# Altium schematic symbol library Regulator_Linear.SchLib: 1452 symbols (part 9 of 10)
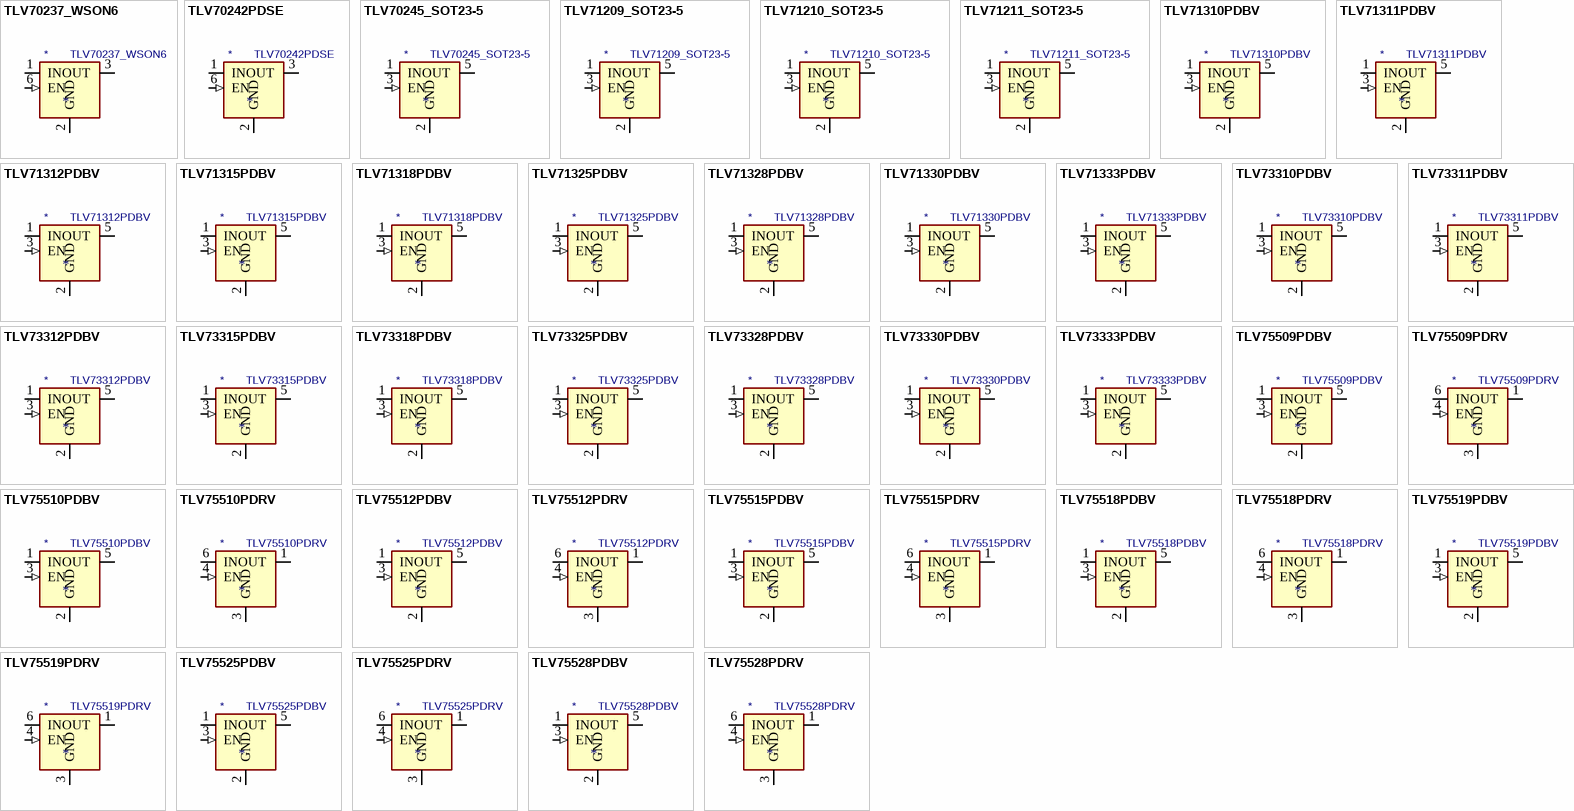
[diagram p44: symbols TLV70237_WSON6 to TLV75528PDRV]

## TLV73318PDBV
designator *  value TLV73318PDBV
ki_keywords: 300mA LDO Regulator Fixed Positive Capacitor-Free; ki_description: 300mA Capacitor-Free Low Dropout Voltage Regulator, Fixed Output 1.8V, SOT-23-5; ki_fp_filters: SOT?23*; Footprint: Package_TO_SOT_SMD:SOT-23-5; Supplier: http://www.ti.com/lit/ds/symlink/tlv733p.pdf
footprint SOT-23-5
pins: 1 IN (power), 2 GND (power), 3 EN (in), 4 NC (in) hidden, 5 OUT (power)

## TLV73325PDBV
designator *  value TLV73325PDBV
ki_keywords: 300mA LDO Regulator Fixed Positive Capacitor-Free; ki_description: 300mA Capacitor-Free Low Dropout Voltage Regulator, Fixed Output 2.5V, SOT-23-5; ki_fp_filters: SOT?23*; Footprint: Package_TO_SOT_SMD:SOT-23-5; Supplier: http://www.ti.com/lit/ds/symlink/tlv733p.pdf
footprint SOT-23-5
pins: 1 IN (power), 2 GND (power), 3 EN (in), 4 NC (in) hidden, 5 OUT (power)

## TLV73328PDBV
designator *  value TLV73328PDBV
ki_keywords: 300mA LDO Regulator Fixed Positive Capacitor-Free; ki_description: 300mA Capacitor-Free Low Dropout Voltage Regulator, Fixed Output 2.8V, SOT-23-5; ki_fp_filters: SOT?23*; Footprint: Package_TO_SOT_SMD:SOT-23-5; Supplier: http://www.ti.com/lit/ds/symlink/tlv733p.pdf
footprint SOT-23-5
pins: 1 IN (power), 2 GND (power), 3 EN (in), 4 NC (in) hidden, 5 OUT (power)

## TLV73330PDBV
designator *  value TLV73330PDBV
ki_keywords: 300mA LDO Regulator Fixed Positive Capacitor-Free; ki_description: 300mA Capacitor-Free Low Dropout Voltage Regulator, Fixed Output 3.0V, SOT-23-5; ki_fp_filters: SOT?23*; Footprint: Package_TO_SOT_SMD:SOT-23-5; Supplier: http://www.ti.com/lit/ds/symlink/tlv733p.pdf
footprint SOT-23-5
pins: 1 IN (power), 2 GND (power), 3 EN (in), 4 NC (in) hidden, 5 OUT (power)

## TLV73333PDBV
designator *  value TLV73333PDBV
ki_keywords: 300mA LDO Regulator Fixed Positive Capacitor-Free; ki_description: 300mA Capacitor-Free Low Dropout Voltage Regulator, Fixed Output 3.3V, SOT-23-5; ki_fp_filters: SOT?23*; Footprint: Package_TO_SOT_SMD:SOT-23-5; Supplier: http://www.ti.com/lit/ds/symlink/tlv733p.pdf
footprint SOT-23-5
pins: 1 IN (power), 2 GND (power), 3 EN (in), 4 NC (in) hidden, 5 OUT (power)

## TLV75509PDBV
designator *  value TLV75509PDBV
ki_keywords: LDO Regulator Fixed Positive; ki_description: 500mA Low IQ Small Size Low Dropout Voltage Regulator, Fixed Output 0.9V, SOT-23-5; ki_fp_filters: SOT?23*; Footprint: Package_TO_SOT_SMD:SOT-23-5; Supplier: http://www.ti.com/lit/ds/symlink/tlv755p.pdf
footprint SOT-23-5
pins: 1 IN (power), 2 GND (power), 3 EN (in), 4 NC (in) hidden, 5 OUT (power)

## TLV75509PDRV
designator *  value TLV75509PDRV
ki_keywords: LDO Regulator Fixed Positive; ki_description: 500mA Low Dropout Voltage Regulator, Fixed Output 0.9V, WSON6; ki_fp_filters: WSON*1EP*2x2mm*P0.65mm*; Footprint: Package_SON:WSON-6-1EP_2x2mm_P0.65mm_EP1x1.6mm; Supplier: http://www.ti.com/lit/ds/symlink/tlv755p.pdf
footprint WSON-6-1EP_2x2mm_P0.65mm_EP1x1.6mm
pins: 1 OUT (power), 2 NC (in) hidden, 3 GND (power), 4 EN (in), 5 NC (in) hidden, 6 IN (power), 7 GND hidden

## TLV75510PDBV
designator *  value TLV75510PDBV
ki_keywords: LDO Regulator Fixed Positive; ki_description: 500mA Low IQ Small Size Low Dropout Voltage Regulator, Fixed Output 1.0V, SOT-23-5; ki_fp_filters: SOT?23*; Footprint: Package_TO_SOT_SMD:SOT-23-5; Supplier: http://www.ti.com/lit/ds/symlink/tlv755p.pdf
footprint SOT-23-5
pins: 1 IN (power), 2 GND (power), 3 EN (in), 4 NC (in) hidden, 5 OUT (power)

## TLV75510PDRV
designator *  value TLV75510PDRV
ki_keywords: LDO Regulator Fixed Positive; ki_description: 500mA Low Dropout Voltage Regulator, Fixed Output 1.0V, WSON6; ki_fp_filters: WSON*1EP*2x2mm*P0.65mm*; Footprint: Package_SON:WSON-6-1EP_2x2mm_P0.65mm_EP1x1.6mm; Supplier: http://www.ti.com/lit/ds/symlink/tlv755p.pdf
footprint WSON-6-1EP_2x2mm_P0.65mm_EP1x1.6mm
pins: 1 OUT (power), 2 NC (in) hidden, 3 GND (power), 4 EN (in), 5 NC (in) hidden, 6 IN (power), 7 GND hidden

## TLV75512PDBV
designator *  value TLV75512PDBV
ki_keywords: LDO Regulator Fixed Positive; ki_description: 500mA Low IQ Small Size Low Dropout Voltage Regulator, Fixed Output 1.2V, SOT-23-5; ki_fp_filters: SOT?23*; Footprint: Package_TO_SOT_SMD:SOT-23-5; Supplier: http://www.ti.com/lit/ds/symlink/tlv755p.pdf
footprint SOT-23-5
pins: 1 IN (power), 2 GND (power), 3 EN (in), 4 NC (in) hidden, 5 OUT (power)

## TLV75512PDRV
designator *  value TLV75512PDRV
ki_keywords: LDO Regulator Fixed Positive; ki_description: 500mA Low Dropout Voltage Regulator, Fixed Output 1.2V, WSON6; ki_fp_filters: WSON*1EP*2x2mm*P0.65mm*; Footprint: Package_SON:WSON-6-1EP_2x2mm_P0.65mm_EP1x1.6mm; Supplier: http://www.ti.com/lit/ds/symlink/tlv755p.pdf
footprint WSON-6-1EP_2x2mm_P0.65mm_EP1x1.6mm
pins: 1 OUT (power), 2 NC (in) hidden, 3 GND (power), 4 EN (in), 5 NC (in) hidden, 6 IN (power), 7 GND hidden

## TLV75515PDBV
designator *  value TLV75515PDBV
ki_keywords: LDO Regulator Fixed Positive; ki_description: 500mA Low Dropout Voltage Regulator, Fixed Output 1.5V, SOT-23-5; ki_fp_filters: SOT?23*; Footprint: Package_TO_SOT_SMD:SOT-23-5; Supplier: http://www.ti.com/lit/ds/symlink/tlv755p.pdf
footprint SOT-23-5
pins: 1 IN (power), 2 GND (power), 3 EN (in), 4 NC (in) hidden, 5 OUT (power)

## TLV75515PDRV
designator *  value TLV75515PDRV
ki_keywords: LDO Regulator Fixed Positive; ki_description: 500mA Low Dropout Voltage Regulator, Fixed Output 1.5V, WSON6; ki_fp_filters: WSON*1EP*2x2mm*P0.65mm*; Footprint: Package_SON:WSON-6-1EP_2x2mm_P0.65mm_EP1x1.6mm; Supplier: http://www.ti.com/lit/ds/symlink/tlv755p.pdf
footprint WSON-6-1EP_2x2mm_P0.65mm_EP1x1.6mm
pins: 1 OUT (power), 2 NC (in) hidden, 3 GND (power), 4 EN (in), 5 NC (in) hidden, 6 IN (power), 7 GND hidden

## TLV75518PDBV
designator *  value TLV75518PDBV
ki_keywords: LDO Regulator Fixed Positive; ki_description: 500mA Low Dropout Voltage Regulator, Fixed Output 1.8V, SOT-23-5; ki_fp_filters: SOT?23*; Footprint: Package_TO_SOT_SMD:SOT-23-5; Supplier: http://www.ti.com/lit/ds/symlink/tlv755p.pdf
footprint SOT-23-5
pins: 1 IN (power), 2 GND (power), 3 EN (in), 4 NC (in) hidden, 5 OUT (power)

## TLV75518PDRV
designator *  value TLV75518PDRV
ki_keywords: LDO Regulator Fixed Positive; ki_description: 500mA Low Dropout Voltage Regulator, Fixed Output 1.8V, WSON6; ki_fp_filters: WSON*1EP*2x2mm*P0.65mm*; Footprint: Package_SON:WSON-6-1EP_2x2mm_P0.65mm_EP1x1.6mm; Supplier: http://www.ti.com/lit/ds/symlink/tlv755p.pdf
footprint WSON-6-1EP_2x2mm_P0.65mm_EP1x1.6mm
pins: 1 OUT (power), 2 NC (in) hidden, 3 GND (power), 4 EN (in), 5 NC (in) hidden, 6 IN (power), 7 GND hidden

## TLV75519PDBV
designator *  value TLV75519PDBV
ki_keywords: LDO Regulator Fixed Positive; ki_description: 500mA Low Dropout Voltage Regulator, Fixed Output 1.9V, SOT-23-5; ki_fp_filters: SOT?23*; Footprint: Package_TO_SOT_SMD:SOT-23-5; Supplier: http://www.ti.com/lit/ds/symlink/tlv755p.pdf
footprint SOT-23-5
pins: 1 IN (power), 2 GND (power), 3 EN (in), 4 NC (in) hidden, 5 OUT (power)

## TLV75519PDRV
designator *  value TLV75519PDRV
ki_keywords: LDO Regulator Fixed Positive; ki_description: 500mA Low Dropout Voltage Regulator, Fixed Output 1.9V, WSON6; ki_fp_filters: WSON*1EP*2x2mm*P0.65mm*; Footprint: Package_SON:WSON-6-1EP_2x2mm_P0.65mm_EP1x1.6mm; Supplier: http://www.ti.com/lit/ds/symlink/tlv755p.pdf
footprint WSON-6-1EP_2x2mm_P0.65mm_EP1x1.6mm
pins: 1 OUT (power), 2 NC (in) hidden, 3 GND (power), 4 EN (in), 5 NC (in) hidden, 6 IN (power), 7 GND hidden

## TLV75525PDBV
designator *  value TLV75525PDBV
ki_keywords: LDO Regulator Fixed Positive; ki_description: 500mA Low Dropout Voltage Regulator, Fixed Output 2.5V, SOT-23-5; ki_fp_filters: SOT?23*; Footprint: Package_TO_SOT_SMD:SOT-23-5; Supplier: http://www.ti.com/lit/ds/symlink/tlv755p.pdf
footprint SOT-23-5
pins: 1 IN (power), 2 GND (power), 3 EN (in), 4 NC (in) hidden, 5 OUT (power)

## TLV75525PDRV
designator *  value TLV75525PDRV
ki_keywords: LDO Regulator Fixed Positive; ki_description: 500mA Low Dropout Voltage Regulator, Fixed Output 2.5V, WSON6; ki_fp_filters: WSON*1EP*2x2mm*P0.65mm*; Footprint: Package_SON:WSON-6-1EP_2x2mm_P0.65mm_EP1x1.6mm; Supplier: http://www.ti.com/lit/ds/symlink/tlv755p.pdf
footprint WSON-6-1EP_2x2mm_P0.65mm_EP1x1.6mm
pins: 1 OUT (power), 2 NC (in) hidden, 3 GND (power), 4 EN (in), 5 NC (in) hidden, 6 IN (power), 7 GND hidden

## TLV75528PDBV
designator *  value TLV75528PDBV
ki_keywords: LDO Regulator Fixed Positive; ki_description: 500mA Low Dropout Voltage Regulator, Fixed Output 2.8V, SOT-23-5; ki_fp_filters: SOT?23*; Footprint: Package_TO_SOT_SMD:SOT-23-5; Supplier: http://www.ti.com/lit/ds/symlink/tlv755p.pdf
footprint SOT-23-5
pins: 1 IN (power), 2 GND (power), 3 EN (in), 4 NC (in) hidden, 5 OUT (power)

## TLV75528PDRV
designator *  value TLV75528PDRV
ki_keywords: LDO Regulator Fixed Positive; ki_description: 500mA Low Dropout Voltage Regulator, Fixed Output 2.8V, WSON6; ki_fp_filters: WSON*1EP*2x2mm*P0.65mm*; Footprint: Package_SON:WSON-6-1EP_2x2mm_P0.65mm_EP1x1.6mm; Supplier: http://www.ti.com/lit/ds/symlink/tlv755p.pdf
footprint WSON-6-1EP_2x2mm_P0.65mm_EP1x1.6mm
pins: 1 OUT (power), 2 NC (in) hidden, 3 GND (power), 4 EN (in), 5 NC (in) hidden, 6 IN (power), 7 GND hidden

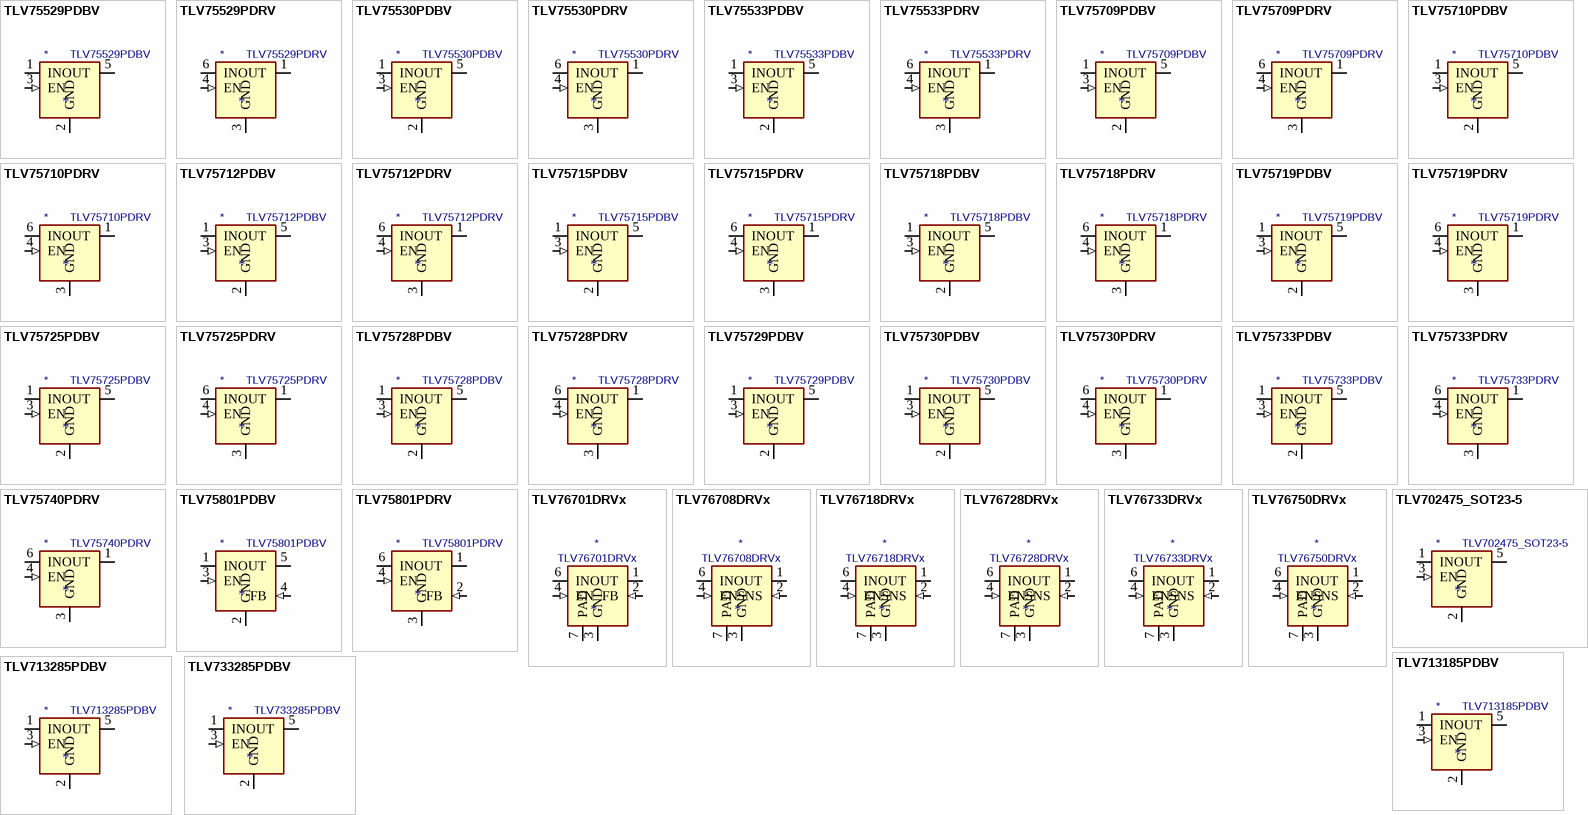
[diagram p32: symbols TLV75529PDBV to TLV733285PDBV]

## TLV75529PDBV
designator *  value TLV75529PDBV
ki_keywords: LDO Regulator Fixed Positive; ki_description: 500mA Low Dropout Voltage Regulator, Fixed Output 2.9V, SOT-23-5; ki_fp_filters: SOT?23*; Footprint: Package_TO_SOT_SMD:SOT-23-5; Supplier: http://www.ti.com/lit/ds/symlink/tlv755p.pdf
footprint SOT-23-5
pins: 1 IN (power), 2 GND (power), 3 EN (in), 4 NC (in) hidden, 5 OUT (power)

## TLV75529PDRV
designator *  value TLV75529PDRV
ki_keywords: LDO Regulator Fixed Positive; ki_description: 500mA Low Dropout Voltage Regulator, Fixed Output 2.9V, WSON6; ki_fp_filters: WSON*1EP*2x2mm*P0.65mm*; Footprint: Package_SON:WSON-6-1EP_2x2mm_P0.65mm_EP1x1.6mm; Supplier: http://www.ti.com/lit/ds/symlink/tlv755p.pdf
footprint WSON-6-1EP_2x2mm_P0.65mm_EP1x1.6mm
pins: 1 OUT (power), 2 NC (in) hidden, 3 GND (power), 4 EN (in), 5 NC (in) hidden, 6 IN (power), 7 GND hidden

## TLV75530PDBV
designator *  value TLV75530PDBV
ki_keywords: LDO Regulator Fixed Positive; ki_description: 500mA Low Dropout Voltage Regulator, Fixed Output 3.0V, SOT-23-5; ki_fp_filters: SOT?23*; Footprint: Package_TO_SOT_SMD:SOT-23-5; Supplier: http://www.ti.com/lit/ds/symlink/tlv755p.pdf
footprint SOT-23-5
pins: 1 IN (power), 2 GND (power), 3 EN (in), 4 NC (in) hidden, 5 OUT (power)

## TLV75530PDRV
designator *  value TLV75530PDRV
ki_keywords: LDO Regulator Fixed Positive; ki_description: 500mA Low Dropout Voltage Regulator, Fixed Output 3.0V, WSON6; ki_fp_filters: WSON*1EP*2x2mm*P0.65mm*; Footprint: Package_SON:WSON-6-1EP_2x2mm_P0.65mm_EP1x1.6mm; Supplier: http://www.ti.com/lit/ds/symlink/tlv755p.pdf
footprint WSON-6-1EP_2x2mm_P0.65mm_EP1x1.6mm
pins: 1 OUT (power), 2 NC (in) hidden, 3 GND (power), 4 EN (in), 5 NC (in) hidden, 6 IN (power), 7 GND hidden

## TLV75533PDBV
designator *  value TLV75533PDBV
ki_keywords: LDO Regulator Fixed Positive; ki_description: 500mA Low Dropout Voltage Regulator, Fixed Output 3.3V, SOT-23-5; ki_fp_filters: SOT?23*; Footprint: Package_TO_SOT_SMD:SOT-23-5; Supplier: http://www.ti.com/lit/ds/symlink/tlv755p.pdf
footprint SOT-23-5
pins: 1 IN (power), 2 GND (power), 3 EN (in), 4 NC (in) hidden, 5 OUT (power)

## TLV75533PDRV
designator *  value TLV75533PDRV
ki_keywords: LDO Regulator Fixed Positive; ki_description: 500mA Low Dropout Voltage Regulator, Fixed Output 3.3V, WSON6; ki_fp_filters: WSON*1EP*2x2mm*P0.65mm*; Footprint: Package_SON:WSON-6-1EP_2x2mm_P0.65mm_EP1x1.6mm; Supplier: http://www.ti.com/lit/ds/symlink/tlv755p.pdf
footprint WSON-6-1EP_2x2mm_P0.65mm_EP1x1.6mm
pins: 1 OUT (power), 2 NC (in) hidden, 3 GND (power), 4 EN (in), 5 NC (in) hidden, 6 IN (power), 7 GND hidden

## TLV75709PDBV
designator *  value TLV75709PDBV
ki_keywords: LDO Regulator Fixed Positive; ki_description: 1A Low IQ Small Size Low Dropout Voltage Regulator, Fixed Output 0.9V, SOT-23-5; ki_fp_filters: SOT?23*; Footprint: Package_TO_SOT_SMD:SOT-23-5; Supplier: https://www.ti.com/lit/ds/symlink/tlv757p.pdf
footprint SOT-23-5
pins: 1 IN (power), 2 GND (power), 3 EN (in), 4 NC (in) hidden, 5 OUT (power)

## TLV75709PDRV
designator *  value TLV75709PDRV
ki_keywords: LDO Regulator Fixed Positive; ki_description: 1A Low IQ Small Size Low Dropout Voltage Regulator, Fixed Output 0.9V, WSON6; ki_fp_filters: WSON*1EP*2x2mm*P0.65mm*; Footprint: Package_SON:WSON-6-1EP_2x2mm_P0.65mm_EP1x1.6mm; Supplier: https://www.ti.com/lit/ds/symlink/tlv757p.pdf
footprint WSON-6-1EP_2x2mm_P0.65mm_EP1x1.6mm
pins: 1 OUT (power), 2 NC (in) hidden, 3 GND (power), 4 EN (in), 5 NC (in) hidden, 6 IN (power), 7 GND hidden

## TLV75710PDBV
designator *  value TLV75710PDBV
ki_keywords: LDO Regulator Fixed Positive; ki_description: 1A Low IQ Small Size Low Dropout Voltage Regulator, Fixed Output 1.0V, SOT-23-5; ki_fp_filters: SOT?23*; Footprint: Package_TO_SOT_SMD:SOT-23-5; Supplier: https://www.ti.com/lit/ds/symlink/tlv757p.pdf
footprint SOT-23-5
pins: 1 IN (power), 2 GND (power), 3 EN (in), 4 NC (in) hidden, 5 OUT (power)

## TLV75710PDRV
designator *  value TLV75710PDRV
ki_keywords: LDO Regulator Fixed Positive; ki_description: 1A Low IQ Small Size Low Dropout Voltage Regulator, Fixed Output 1.0V, WSON6; ki_fp_filters: WSON*1EP*2x2mm*P0.65mm*; Footprint: Package_SON:WSON-6-1EP_2x2mm_P0.65mm_EP1x1.6mm; Supplier: https://www.ti.com/lit/ds/symlink/tlv757p.pdf
footprint WSON-6-1EP_2x2mm_P0.65mm_EP1x1.6mm
pins: 1 OUT (power), 2 NC (in) hidden, 3 GND (power), 4 EN (in), 5 NC (in) hidden, 6 IN (power), 7 GND hidden

## TLV75712PDBV
designator *  value TLV75712PDBV
ki_keywords: LDO Regulator Fixed Positive; ki_description: 1A Low IQ Small Size Low Dropout Voltage Regulator, Fixed Output 1.2V, SOT-23-5; ki_fp_filters: SOT?23*; Footprint: Package_TO_SOT_SMD:SOT-23-5; Supplier: https://www.ti.com/lit/ds/symlink/tlv757p.pdf
footprint SOT-23-5
pins: 1 IN (power), 2 GND (power), 3 EN (in), 4 NC (in) hidden, 5 OUT (power)

## TLV75712PDRV
designator *  value TLV75712PDRV
ki_keywords: LDO Regulator Fixed Positive; ki_description: 1A Low IQ Small Size Low Dropout Voltage Regulator, Fixed Output 1.2V, WSON6; ki_fp_filters: WSON*1EP*2x2mm*P0.65mm*; Footprint: Package_SON:WSON-6-1EP_2x2mm_P0.65mm_EP1x1.6mm; Supplier: https://www.ti.com/lit/ds/symlink/tlv757p.pdf
footprint WSON-6-1EP_2x2mm_P0.65mm_EP1x1.6mm
pins: 1 OUT (power), 2 NC (in) hidden, 3 GND (power), 4 EN (in), 5 NC (in) hidden, 6 IN (power), 7 GND hidden

## TLV75715PDBV
designator *  value TLV75715PDBV
ki_keywords: LDO Regulator Fixed Positive; ki_description: 1A Low IQ Small Size Low Dropout Voltage Regulator, Fixed Output 1.5V, SOT-23-5; ki_fp_filters: SOT?23*; Footprint: Package_TO_SOT_SMD:SOT-23-5; Supplier: https://www.ti.com/lit/ds/symlink/tlv757p.pdf
footprint SOT-23-5
pins: 1 IN (power), 2 GND (power), 3 EN (in), 4 NC (in) hidden, 5 OUT (power)

## TLV75715PDRV
designator *  value TLV75715PDRV
ki_keywords: LDO Regulator Fixed Positive; ki_description: 1A Low IQ Small Size Low Dropout Voltage Regulator, Fixed Output 1.5V, WSON6; ki_fp_filters: WSON*1EP*2x2mm*P0.65mm*; Footprint: Package_SON:WSON-6-1EP_2x2mm_P0.65mm_EP1x1.6mm; Supplier: https://www.ti.com/lit/ds/symlink/tlv757p.pdf
footprint WSON-6-1EP_2x2mm_P0.65mm_EP1x1.6mm
pins: 1 OUT (power), 2 NC (in) hidden, 3 GND (power), 4 EN (in), 5 NC (in) hidden, 6 IN (power), 7 GND hidden

## TLV75718PDBV
designator *  value TLV75718PDBV
ki_keywords: LDO Regulator Fixed Positive; ki_description: 1A Low IQ Small Size Low Dropout Voltage Regulator, Fixed Output 1.8V, SOT-23-5; ki_fp_filters: SOT?23*; Footprint: Package_TO_SOT_SMD:SOT-23-5; Supplier: https://www.ti.com/lit/ds/symlink/tlv757p.pdf
footprint SOT-23-5
pins: 1 IN (power), 2 GND (power), 3 EN (in), 4 NC (in) hidden, 5 OUT (power)

## TLV75718PDRV
designator *  value TLV75718PDRV
ki_keywords: LDO Regulator Fixed Positive; ki_description: 1A Low IQ Small Size Low Dropout Voltage Regulator, Fixed Output 1.8V, WSON6; ki_fp_filters: WSON*1EP*2x2mm*P0.65mm*; Footprint: Package_SON:WSON-6-1EP_2x2mm_P0.65mm_EP1x1.6mm; Supplier: https://www.ti.com/lit/ds/symlink/tlv757p.pdf
footprint WSON-6-1EP_2x2mm_P0.65mm_EP1x1.6mm
pins: 1 OUT (power), 2 NC (in) hidden, 3 GND (power), 4 EN (in), 5 NC (in) hidden, 6 IN (power), 7 GND hidden

## TLV75719PDBV
designator *  value TLV75719PDBV
ki_keywords: LDO Regulator Fixed Positive; ki_description: 1A Low IQ Small Size Low Dropout Voltage Regulator, Fixed Output 1.9V, SOT-23-5; ki_fp_filters: SOT?23*; Footprint: Package_TO_SOT_SMD:SOT-23-5; Supplier: https://www.ti.com/lit/ds/symlink/tlv757p.pdf
footprint SOT-23-5
pins: 1 IN (power), 2 GND (power), 3 EN (in), 4 NC (in) hidden, 5 OUT (power)

## TLV75719PDRV
designator *  value TLV75719PDRV
ki_keywords: LDO Regulator Fixed Positive; ki_description: 1A Low IQ Small Size Low Dropout Voltage Regulator, Fixed Output 1.9V, WSON6; ki_fp_filters: WSON*1EP*2x2mm*P0.65mm*; Footprint: Package_SON:WSON-6-1EP_2x2mm_P0.65mm_EP1x1.6mm; Supplier: https://www.ti.com/lit/ds/symlink/tlv757p.pdf
footprint WSON-6-1EP_2x2mm_P0.65mm_EP1x1.6mm
pins: 1 OUT (power), 2 NC (in) hidden, 3 GND (power), 4 EN (in), 5 NC (in) hidden, 6 IN (power), 7 GND hidden

## TLV75725PDBV
designator *  value TLV75725PDBV
ki_keywords: LDO Regulator Fixed Positive; ki_description: 1A Low IQ Small Size Low Dropout Voltage Regulator, Fixed Output 2.5V, SOT-23-5; ki_fp_filters: SOT?23*; Footprint: Package_TO_SOT_SMD:SOT-23-5; Supplier: https://www.ti.com/lit/ds/symlink/tlv757p.pdf
footprint SOT-23-5
pins: 1 IN (power), 2 GND (power), 3 EN (in), 4 NC (in) hidden, 5 OUT (power)

## TLV75725PDRV
designator *  value TLV75725PDRV
ki_keywords: LDO Regulator Fixed Positive; ki_description: 1A Low IQ Small Size Low Dropout Voltage Regulator, Fixed Output 2.5V, WSON6; ki_fp_filters: WSON*1EP*2x2mm*P0.65mm*; Footprint: Package_SON:WSON-6-1EP_2x2mm_P0.65mm_EP1x1.6mm; Supplier: https://www.ti.com/lit/ds/symlink/tlv757p.pdf
footprint WSON-6-1EP_2x2mm_P0.65mm_EP1x1.6mm
pins: 1 OUT (power), 2 NC (in) hidden, 3 GND (power), 4 EN (in), 5 NC (in) hidden, 6 IN (power), 7 GND hidden

## TLV75728PDBV
designator *  value TLV75728PDBV
ki_keywords: LDO Regulator Fixed Positive; ki_description: 1A Low IQ Small Size Low Dropout Voltage Regulator, Fixed Output 2.8V, SOT-23-5; ki_fp_filters: SOT?23*; Footprint: Package_TO_SOT_SMD:SOT-23-5; Supplier: https://www.ti.com/lit/ds/symlink/tlv757p.pdf
footprint SOT-23-5
pins: 1 IN (power), 2 GND (power), 3 EN (in), 4 NC (in) hidden, 5 OUT (power)

## TLV75728PDRV
designator *  value TLV75728PDRV
ki_keywords: LDO Regulator Fixed Positive; ki_description: 1A Low IQ Small Size Low Dropout Voltage Regulator, Fixed Output 2.8V, WSON6; ki_fp_filters: WSON*1EP*2x2mm*P0.65mm*; Footprint: Package_SON:WSON-6-1EP_2x2mm_P0.65mm_EP1x1.6mm; Supplier: https://www.ti.com/lit/ds/symlink/tlv757p.pdf
footprint WSON-6-1EP_2x2mm_P0.65mm_EP1x1.6mm
pins: 1 OUT (power), 2 NC (in) hidden, 3 GND (power), 4 EN (in), 5 NC (in) hidden, 6 IN (power), 7 GND hidden

## TLV75729PDBV
designator *  value TLV75729PDBV
ki_keywords: LDO Regulator Fixed Positive; ki_description: 1A Low IQ Small Size Low Dropout Voltage Regulator, Fixed Output 2.9V, SOT-23-5; ki_fp_filters: SOT?23*; Footprint: Package_TO_SOT_SMD:SOT-23-5; Supplier: https://www.ti.com/lit/ds/symlink/tlv757p.pdf
footprint SOT-23-5
pins: 1 IN (power), 2 GND (power), 3 EN (in), 4 NC (in) hidden, 5 OUT (power)

## TLV75730PDBV
designator *  value TLV75730PDBV
ki_keywords: LDO Regulator Fixed Positive; ki_description: 1A Low IQ Small Size Low Dropout Voltage Regulator, Fixed Output 3.0V, SOT-23-5; ki_fp_filters: SOT?23*; Footprint: Package_TO_SOT_SMD:SOT-23-5; Supplier: https://www.ti.com/lit/ds/symlink/tlv757p.pdf
footprint SOT-23-5
pins: 1 IN (power), 2 GND (power), 3 EN (in), 4 NC (in) hidden, 5 OUT (power)

## TLV75730PDRV
designator *  value TLV75730PDRV
ki_keywords: LDO Regulator Fixed Positive; ki_description: 1A Low IQ Small Size Low Dropout Voltage Regulator, Fixed Output 3.0V, WSON6; ki_fp_filters: WSON*1EP*2x2mm*P0.65mm*; Footprint: Package_SON:WSON-6-1EP_2x2mm_P0.65mm_EP1x1.6mm; Supplier: https://www.ti.com/lit/ds/symlink/tlv757p.pdf
footprint WSON-6-1EP_2x2mm_P0.65mm_EP1x1.6mm
pins: 1 OUT (power), 2 NC (in) hidden, 3 GND (power), 4 EN (in), 5 NC (in) hidden, 6 IN (power), 7 GND hidden

## TLV75733PDBV
designator *  value TLV75733PDBV
ki_keywords: LDO Regulator Fixed Positive; ki_description: 1A Low IQ Small Size Low Dropout Voltage Regulator, Fixed Output 3.3V, SOT-23-5; ki_fp_filters: SOT?23*; Footprint: Package_TO_SOT_SMD:SOT-23-5; Supplier: https://www.ti.com/lit/ds/symlink/tlv757p.pdf
footprint SOT-23-5
pins: 1 IN (power), 2 GND (power), 3 EN (in), 4 NC (in) hidden, 5 OUT (power)

## TLV75733PDRV
designator *  value TLV75733PDRV
ki_keywords: LDO Regulator Fixed Positive; ki_description: 1A Low IQ Small Size Low Dropout Voltage Regulator, Fixed Output 3.3V, WSON6; ki_fp_filters: WSON*1EP*2x2mm*P0.65mm*; Footprint: Package_SON:WSON-6-1EP_2x2mm_P0.65mm_EP1x1.6mm; Supplier: https://www.ti.com/lit/ds/symlink/tlv757p.pdf
footprint WSON-6-1EP_2x2mm_P0.65mm_EP1x1.6mm
pins: 1 OUT (power), 2 NC (in) hidden, 3 GND (power), 4 EN (in), 5 NC (in) hidden, 6 IN (power), 7 GND hidden

## TLV75740PDRV
designator *  value TLV75740PDRV
ki_keywords: LDO Regulator Fixed Positive; ki_description: 1A Low IQ Small Size Low Dropout Voltage Regulator, Fixed Output 4.0V, WSON6; ki_fp_filters: WSON*1EP*2x2mm*P0.65mm*; Footprint: Package_SON:WSON-6-1EP_2x2mm_P0.65mm_EP1x1.6mm; Supplier: https://www.ti.com/lit/ds/symlink/tlv757p.pdf
footprint WSON-6-1EP_2x2mm_P0.65mm_EP1x1.6mm
pins: 1 OUT (power), 2 NC (in) hidden, 3 GND (power), 4 EN (in), 5 NC (in) hidden, 6 IN (power), 7 GND hidden

## TLV75801PDBV
designator *  value TLV75801PDBV
ki_keywords: ldo positive; ki_description: 500mA Low-Dropout Linear Regulator, Adjustable Output, SOT-23-5; ki_fp_filters: SOT?23*; Footprint: Package_TO_SOT_SMD:SOT-23-5; Supplier: https://www.ti.com/lit/ds/symlink/tlv758p.pdf
footprint SOT-23-5
pins: 1 IN (power), 2 GND (power), 3 EN (in), 4 FB (in), 5 OUT (power)

## TLV75801PDRV
designator *  value TLV75801PDRV
ki_keywords: ldo positive; ki_description: 500mA Low-Dropout Linear Regulator, Adjustable Output, WSON-6; ki_fp_filters: WSON*1EP*2x2mm*P0.65mm*; Footprint: Package_SON:WSON-6-1EP_2x2mm_P0.65mm_EP1x1.6mm; Supplier: https://www.ti.com/lit/ds/symlink/tlv758p.pdf
footprint WSON-6-1EP_2x2mm_P0.65mm_EP1x1.6mm
pins: 1 OUT (power), 2 FB (in), 3 GND (power), 4 EN (in), 5 DNC (in) hidden, 6 IN (power), 7 GND hidden

## TLV76701DRVx
designator *  value TLV76701DRVx
ki_keywords: 1A, 16V Precision Linear Voltage Regulator; ki_description: 1A, 16V Precision Linear Voltage Regulator, with enable pin, Adjustable Output 0.8-13.6V, WSON-6; ki_fp_filters: WSON*1EP*2x2mm*P0.65*; Footprint: Package_SON:WSON-6-1EP_2x2mm_P0.65mm_EP1x1.6mm_ThermalVias; Supplier: www.ti.com/lit/gpn/TLV767
footprint WSON-6-1EP_2x2mm_P0.65mm_EP1x1.6mm_ThermalVias
pins: 1 OUT (power), 2 FB (in), 3 GND (power), 4 EN (in), 5 GND hidden, 6 IN (power), 7 PAD

## TLV76708DRVx
designator *  value TLV76708DRVx
ki_keywords: 1A Precision Linear Voltage Regulator; ki_description: 1A Precision Linear Voltage Regulator, with enable pin, Fixed Output 0.8V, WSON6; ki_fp_filters: WSON*1EP*2x2mm*P0.65*; Footprint: Package_SON:WSON-6-1EP_2x2mm_P0.65mm_EP1x1.6mm_ThermalVias; Supplier: www.ti.com/lit/gpn/TLV767
footprint WSON-6-1EP_2x2mm_P0.65mm_EP1x1.6mm_ThermalVias
pins: 1 OUT (power), 2 SNS (in), 3 GND (power), 4 EN (in), 5 GND hidden, 6 IN (power), 7 PAD

## TLV76718DRVx
designator *  value TLV76718DRVx
ki_keywords: 1A Precision Linear Voltage Regulator; ki_description: 1A Precision Linear Voltage Regulator, with enable pin, Fixed Output 1.8V, WSON6; ki_fp_filters: WSON*1EP*2x2mm*P0.65*; Footprint: Package_SON:WSON-6-1EP_2x2mm_P0.65mm_EP1x1.6mm_ThermalVias; Supplier: www.ti.com/lit/gpn/TLV767
footprint WSON-6-1EP_2x2mm_P0.65mm_EP1x1.6mm_ThermalVias
pins: 1 OUT (power), 2 SNS (in), 3 GND (power), 4 EN (in), 5 GND hidden, 6 IN (power), 7 PAD

## TLV76728DRVx
designator *  value TLV76728DRVx
ki_keywords: 1A Precision Linear Voltage Regulator; ki_description: 1A Precision Linear Voltage Regulator, with enable pin, Fixed Output 2.8V, WSON6; ki_fp_filters: WSON*1EP*2x2mm*P0.65*; Footprint: Package_SON:WSON-6-1EP_2x2mm_P0.65mm_EP1x1.6mm_ThermalVias; Supplier: www.ti.com/lit/gpn/TLV767
footprint WSON-6-1EP_2x2mm_P0.65mm_EP1x1.6mm_ThermalVias
pins: 1 OUT (power), 2 SNS (in), 3 GND (power), 4 EN (in), 5 GND hidden, 6 IN (power), 7 PAD

## TLV76733DRVx
designator *  value TLV76733DRVx
ki_keywords: 1A Precision Linear Voltage Regulator; ki_description: 1A Precision Linear Voltage Regulator, with enable pin, Fixed Output 3.3V, WSON6; ki_fp_filters: WSON*1EP*2x2mm*P0.65*; Footprint: Package_SON:WSON-6-1EP_2x2mm_P0.65mm_EP1x1.6mm_ThermalVias; Supplier: www.ti.com/lit/gpn/TLV767
footprint WSON-6-1EP_2x2mm_P0.65mm_EP1x1.6mm_ThermalVias
pins: 1 OUT (power), 2 SNS (in), 3 GND (power), 4 EN (in), 5 GND hidden, 6 IN (power), 7 PAD

## TLV76750DRVx
designator *  value TLV76750DRVx
ki_keywords: 1A, 16V Precision Linear Voltage Regulator; ki_description: 1A, 16V Precision Linear Voltage Regulator, with enable pin, Fixed Output 5.0V, WSON-6; ki_fp_filters: WSON*1EP*2x2mm*P0.65*; Footprint: Package_SON:WSON-6-1EP_2x2mm_P0.65mm_EP1x1.6mm_ThermalVias; Supplier: www.ti.com/lit/gpn/TLV767
footprint WSON-6-1EP_2x2mm_P0.65mm_EP1x1.6mm_ThermalVias
pins: 1 OUT (power), 2 SNS (in), 3 GND (power), 4 EN (in), 5 GND hidden, 6 IN (power), 7 PAD

## TLV702475_SOT23-5
designator *  value TLV702475_SOT23-5
ki_keywords: 300mA LDO Regulator Fixed Positive; ki_description: 300mA Low Dropout Voltage Regulator, Fixed Output 4.75V, SOT-23-5; ki_fp_filters: SOT?23*; Footprint: Package_TO_SOT_SMD:SOT-23-5; Supplier: http://www.ti.com/lit/ds/symlink/tlv702.pdf
footprint SOT-23-5
pins: 1 IN (power), 2 GND (power), 3 EN (in), 4 NC (in) hidden, 5 OUT (power)

## TLV713185PDBV
designator *  value TLV713185PDBV
ki_keywords: LDO Regulator Fixed Positive; ki_description: 150mA Low Dropout Voltage Regulator, Fixed Output 1.8V, SOT-23-5; ki_fp_filters: SOT?23*; Footprint: Package_TO_SOT_SMD:SOT-23-5; Supplier: http://www.ti.com/lit/ds/symlink/tlv713p.pdf
footprint SOT-23-5
pins: 1 IN (power), 2 GND (power), 3 EN (in), 4 NC (in) hidden, 5 OUT (power)

## TLV713285PDBV
designator *  value TLV713285PDBV
ki_keywords: LDO Regulator Fixed Positive; ki_description: 150mA Low Dropout Voltage Regulator, Fixed Output 2.85V, SOT-23-5; ki_fp_filters: SOT?23*; Footprint: Package_TO_SOT_SMD:SOT-23-5; Supplier: http://www.ti.com/lit/ds/symlink/tlv713p.pdf
footprint SOT-23-5
pins: 1 IN (power), 2 GND (power), 3 EN (in), 4 NC (in) hidden, 5 OUT (power)

## TLV733285PDBV
designator *  value TLV733285PDBV
ki_keywords: 300mA LDO Regulator Fixed Positive Capacitor-Free; ki_description: 300mA Capacitor-Free Low Dropout Voltage Regulator, Fixed Output 2.85V, SOT-23-5; ki_fp_filters: SOT?23*; Footprint: Package_TO_SOT_SMD:SOT-23-5; Supplier: http://www.ti.com/lit/ds/symlink/tlv733p.pdf
footprint SOT-23-5
pins: 1 IN (power), 2 GND (power), 3 EN (in), 4 NC (in) hidden, 5 OUT (power)

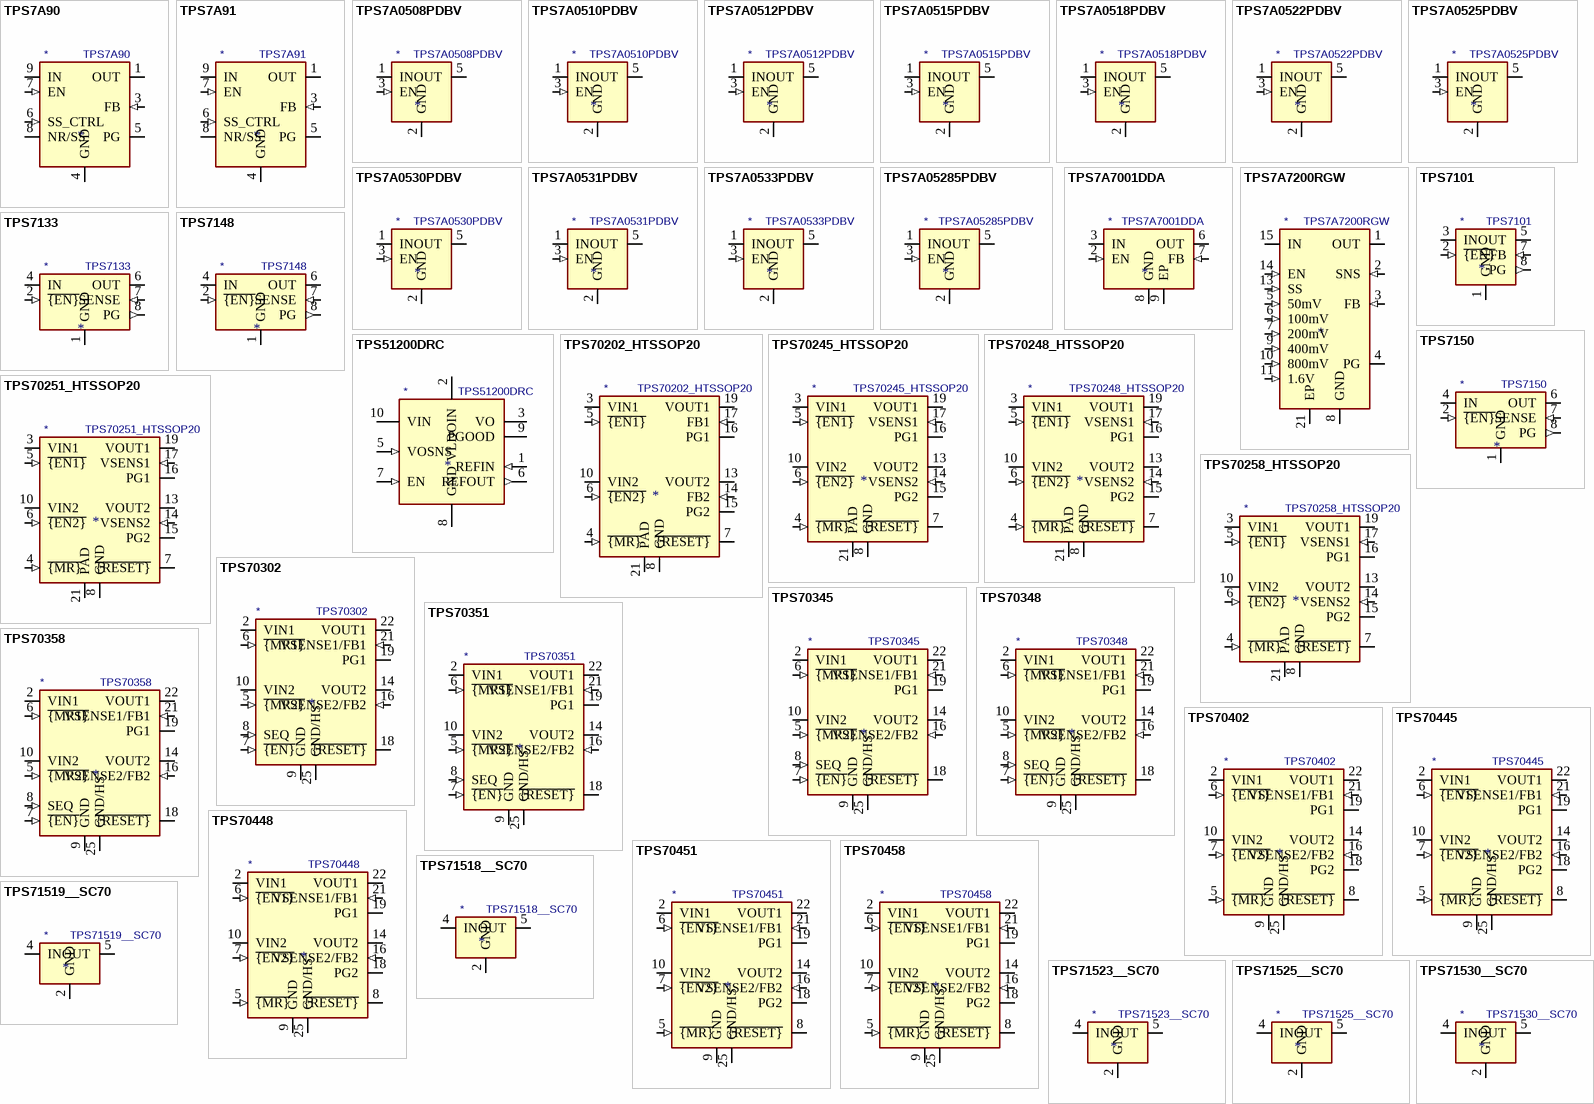
[diagram p33: symbols TPS7A90 to TPS71530__SC70]

## TPS7A90
designator *  value TPS7A90
ki_keywords: LDO voltage regulator; ki_description: 0.5A, High-Accuracy, Low-Noise LDO Voltage Regulator, Texas S-PDSO-N10; ki_fp_filters: Texas*S*PDSO*; Footprint: Package_DFN_QFN:Texas_S-PDSO-N10_EP1.2x2mm; Supplier: http://www.ti.com/lit/ds/symlink/tps7a90.pdf
footprint Texas_S-PDSO-N10_EP1.2x2mm
pins: 1 OUT (power), 2 OUT hidden, 3 FB (in), 4 GND (power), 5 PG (oc), 6 SS_CTRL (in), 7 EN (in), 8 NR/SS, 9 IN (power), 10 IN hidden, 11 GND hidden

## TPS7A91
designator *  value TPS7A91
ki_keywords: LDO voltage regulator; ki_description: 1A, High-Accuracy, Low-Noise LDO Voltage Regulator, Texas S-PDSO-N10; ki_fp_filters: Texas*S*PDSO*; Footprint: Package_DFN_QFN:Texas_S-PDSO-N10_EP1.2x2mm; Supplier: http://www.ti.com/lit/ds/symlink/tps7a91.pdf
footprint Texas_S-PDSO-N10_EP1.2x2mm
pins: 1 OUT (power), 2 OUT hidden, 3 FB (in), 4 GND (power), 5 PG (oc), 6 SS_CTRL (in), 7 EN (in), 8 NR/SS, 9 IN (power), 10 IN hidden, 11 GND hidden